# Altium footprint library 243-436_MP_Man-Ctrl-ESP32.PcbLib: 9 footprints
Each footprint in its own frame and in the unit in brackets; x right, y up, seen from the top. Pads: shape width x height; smd on the part's side, far side on the other; paste and mask are expansions set on the pad; w line width, h text height; cw(c..) or ccw(c..) is an arc to the next point about the centre after c.
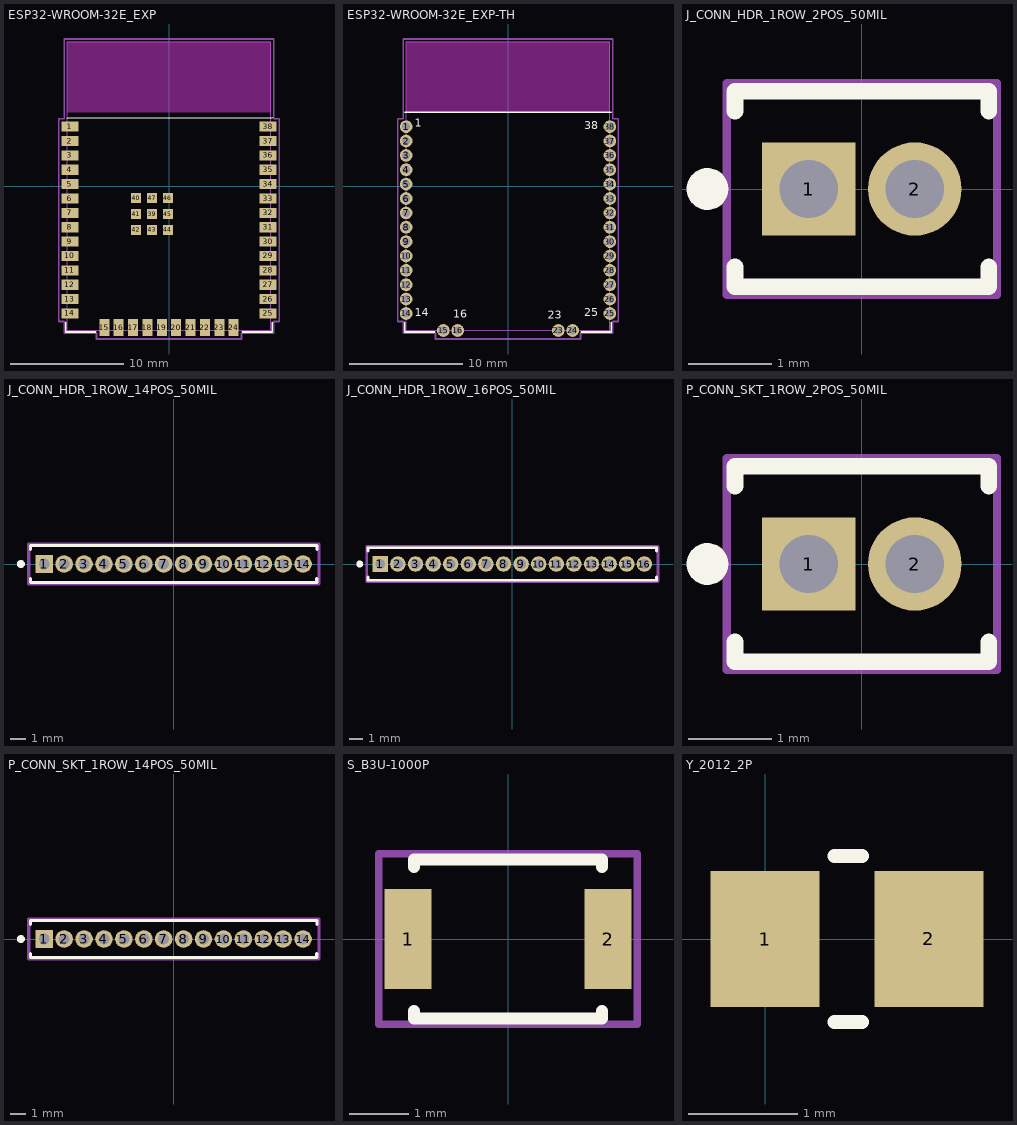
[diagram p0: the footprints below, top view; thin cyan lines are the x and y axes]

## ESP32­WROOM­32E_EXP [mil]
height 196.85
pads (47):
  rect 59x35 smd paste+0 mask+0: 1(-344.5,207.1) 2(-344.5,157.1) 3(-344.5,107.1) 4(-344.5,57.1) 5(-344.5,7.1) 6(-344.5,-42.9) 7(-344.5,-92.9) 8(-344.5,-142.9) 9(-344.5,-192.9) 10(-344.5,-242.9) 11(-344.5,-292.9) 12(-344.5,-342.9) 13(-344.5,-392.9) 14(-344.5,-442.9) 25(344.5,-442.9) 26(344.5,-392.9) 27(344.5,-342.9) 28(344.5,-292.9) 29(344.5,-242.9) 30(344.5,-192.9) 31(344.5,-142.9) 32(344.5,-92.9) 33(344.5,-42.9) 34(344.5,7.1) 35(344.5,57.1) 36(344.5,107.1) 37(344.5,157.1) 38(344.5,207.1)
  rect 35x59 smd paste+0 mask+0: 15(-225,-492.15) 16(-175,-492.15) 17(-125,-492.15) 18(-75,-492.15) 19(-25,-492.15) 20(25,-492.15) 21(75,-492.15) 22(125,-492.15) 23(175,-492.15) 24(225,-492.15)
  rect 35x35 smd paste+0 mask+0: 39(-59.1,-96.9) 40(-114.2,-41.8) 41(-114.2,-96.9) 42(-114.2,-152) 43(-59.1,-152) 44(-4,-152) 45(-4,-96.9) 46(-4,-41.8) 47(-59.1,-41.8)
Top Overlay:
  lines w6: -359.5,-473.5 -359.5,-507 -255.6,-507 ; -354.33,236.22 359.5,237.7 ; 255.6,-507 359.5,-507 359.5,-473.5
Keep-Out Layer:
  region: 354.5,258 354.5,502 -354.5,502 -354.5,258
Top Courtyard:
  lines w6: -384,-470.4 -364.5,-470.4 -364.5,-512 -252.5,-512 -252.5,-531.65 252.5,-531.65 252.5,-512 364.5,-512 364.5,-470.4 384,-470.4 384,234.6 364.5,234.6 364.5,512 -364.5,512 -364.5,234.6 -384,234.6 -384,-470.4
Top Designator:
  text ".Designator" at -68.9,-2.45 h39.37
Top 3D Body:
  lines w1: -354.5,-502 354.5,-502 354.5,502 -354.5,502 -354.5,-502
3D body "User Library-ESP32-WROOM-32E-1.STEP": height 124.02, standoff -0.71, extent -355.04,-502.68 355.04,501.97

## ESP32­WROOM­32E_EXP-TH [mm]
height 3
pads (32):
  round 1.12 hole 0.7 paste-2539.97 mask+0: 1(-9,5.26) 2(-9,3.99) 3(-9,2.72) 4(-9,1.45) 5(-9,0.18) 6(-9,-1.09) 7(-9,-2.36) 8(-9,-3.63) 9(-9,-4.9) 10(-9,-6.17) 11(-9,-7.44) 12(-9,-8.71) 13(-9,-9.98) 14(-9,-11.25) 15(-5.715,-12.751) 16(-4.445,-12.751) 23(4.445,-12.751) 24(5.715,-12.751) 25(9,-11.25) 26(9,-9.98) 27(9,-8.71) 28(9,-7.44) 29(9,-6.17) 30(9,-4.9) 31(9,-3.63) 32(9,-2.36) 33(9,-1.09) 34(9,0.18) 35(9,1.45) 36(9,2.72) 37(9,3.99) 38(9,5.26)
Top Overlay:
  lines w0.152: -9.131,-12.027 -9.131,-12.878 -6.492,-12.878 ; -9.131,6.528 9.131,6.528 ; 6.492,-12.878 9.131,-12.878 9.131,-12.027
  text "1" at -8.25,5 h1.2
  text "14" at -8.25,-11.75 h1.2
  text "23" at 3.499,-11.987 h1.2
  text "25" at 6.749,-11.737 h1.2
  text "38" at 6.75,4.763 h1.2
  text "16" at -4.85,-11.888 h1.2
Keep-Out Layer:
  region: 9.004,6.553 9.004,12.751 -9.004,12.751 -9.004,6.553
Top Courtyard:
  lines w0.152: -9.754,-11.948 -9.258,-11.948 -9.258,-13.005 -6.414,-13.005 -6.414,-13.504 6.413,-13.504 6.413,-13.005 9.258,-13.005 9.258,-11.948 9.754,-11.948 9.754,5.959 9.258,5.959 9.258,13.005 -9.258,13.005 -9.258,5.959 -9.754,5.959 -9.754,-11.948
Top Designator:
  text ".Designator" at -2.25,-0.312 h1
Top 3D Body:
  lines w0.025: -9.004,-12.751 9.004,-12.751 9.004,12.751 -9.004,12.751 -9.004,-12.751
3D body "User Library-ESP32-WROOM-32E-1.STEP": height 10.15, standoff 6.98, extent -9.018,-12.75 9.018,12.768
3D body "Conn_Sullins_GRPB021VWVN-RC_eec.STEP": height -2.9, standoff -9.6, extent -6.345,-13.822 -3.805,-11.681
3D body "Conn_Sullins_GRPB021VWVN-RC_eec.STEP": height -2.9, standoff -9.6, extent 3.815,-13.822 6.355,-11.681
3D body "GRPB141VWVN-RC.STEP": height 9.21, standoff 2.91, extent 7.934,-11.885 10.067,5.895
3D body "GRPB141VWVN-RC.STEP": height 9.21, standoff 2.91, extent -10.067,-11.885 -7.934,5.895

## J_CONN_HDR_1ROW_2POS_50MIL [mm]
height 8.58
pads (2):
  rect 1.12x1.12 hole 0.7 paste-2539.97 mask+0: 1(-0.635,0)
  round 1.12 hole 0.7 paste-2539.97 mask+0: 2(0.635,0)
Top Overlay:
  circle w0.25: c-1.85,0 r0.125
  lines w0.2: -1.52,-0.935 -1.52,-1.17 1.52,-1.17 1.52,-0.935 ; -1.52,0.935 -1.52,1.17 1.52,1.17 1.52,0.935
Top Courtyard:
  lines w0.1: -1.62,-1.27 1.62,-1.27 1.62,1.27 -1.62,1.27 -1.62,-1.27
Top Designator:
  text ".Designator" at 0,0.188 h1
3D body "Conn_Sullins_GRPB021VWVN-RC_eec.STEP": height 4.4, standoff -2.3, extent -1.275,-1.071 1.265,1.07

## J_CONN_HDR_1ROW_14POS_50MIL [mm]
height 8.58
pads (14):
  rect 1.12x1.12 hole 0.7 paste-2539.97 mask+0: 1(-8.255,0)
  round 1.12 hole 0.7 paste-2539.97 mask+0: 2(-6.985,0) 3(-5.715,0) 4(-4.445,0) 5(-3.175,0) 6(-1.905,0) 7(-0.635,0) 8(0.635,0) 9(1.905,0) 10(3.175,0) 11(4.445,0) 12(5.715,0) 13(6.985,0) 14(8.255,0)
Top Overlay:
  circle w0.25: c-9.74,0 r0.125
  lines w0.2: -9.14,-0.935 -9.14,-1.17 9.123,-1.17 9.123,-0.935 ; -9.14,0.935 -9.14,1.17 9.137,1.17 9.137,0.935
Top Courtyard:
  lines w0.2: -9.24,-1.27 9.27,-1.27 9.27,1.27 -9.24,1.27 -9.24,-1.27
Top Designator:
  text ".Designator" at -2.25,0.25 h1
3D body "GRPB141VWVN-RC.STEP": height 3.99, standoff -2.31, extent -8.89,-1.067 8.89,1.067

## J_CONN_HDR_1ROW_16POS_50MIL [mm]
height 8.58
pads (16):
  rect 1.12x1.12 hole 0.7 paste-2539.97 mask+0: 1(-9.525,0)
  round 1.12 hole 0.7 paste-2539.97 mask+0: 2(-8.255,0) 3(-6.985,0) 4(-5.715,0) 5(-4.445,0) 6(-3.175,0) 7(-1.905,0) 8(-0.635,0) 9(0.635,0) 10(1.905,0) 11(3.175,0) 12(4.445,0) 13(5.715,0) 14(6.985,0) 15(8.255,0) 16(9.525,0)
Top Overlay:
  circle w0.25: c-11.01,0 r0.125
  lines w0.2: -10.41,-0.935 -10.41,-1.17 10.41,-1.17 10.41,-0.935 ; -10.41,0.935 -10.41,1.17 10.41,1.17 10.41,0.935
Top Courtyard:
  lines w0.2: -10.51,-1.27 -10.51,1.27 10.51,1.27 10.51,-1.27 -10.51,-1.27
Top Designator:
  text ".Designator" at 0,0.188 h1
3D body "Conn_Sullins_GRPB161VWVN-RC_eec.STEP": height 4.4, standoff -2.3, extent -10.16,-1.072 10.16,1.07

## P_CONN_SKT_1ROW_2POS_50MIL [mm]
height 8.58
pads (2):
  rect 1.12x1.12 hole 0.7 paste-2539.97 mask+0: 1(-0.635,0)
  round 1.12 hole 0.7 paste-2539.97 mask+0: 2(0.635,0)
Top Overlay:
  circle w0.25: c-1.85,0 r0.125
  lines w0.2: -1.52,-0.935 -1.52,-1.17 1.52,-1.17 1.52,-0.935 ; -1.52,0.935 -1.52,1.17 1.52,1.17 1.52,0.935
Top Courtyard:
  lines w0.1: -1.62,-1.27 1.62,-1.27 1.62,1.27 -1.62,1.27 -1.62,-1.27
Top Designator:
  text ".Designator" at 0,0.188 h1
3D body "SLM-102-01-G-S.stp": height 4.57, standoff -2.92, extent -1.384,-1.27 1.384,1.27

## P_CONN_SKT_1ROW_14POS_50MIL [mm]
height 8.58
pads (14):
  rect 1.12x1.12 hole 0.7 paste-2539.97 mask+0: 1(-8.255,0)
  round 1.12 hole 0.7 paste-2539.97 mask+0: 2(-6.985,0) 3(-5.715,0) 4(-4.445,0) 5(-3.175,0) 6(-1.905,0) 7(-0.635,0) 8(0.635,0) 9(1.905,0) 10(3.175,0) 11(4.445,0) 12(5.715,0) 13(6.985,0) 14(8.255,0)
Top Overlay:
  circle w0.25: c-9.74,0 r0.125
  lines w0.2: -9.14,-0.935 -9.14,-1.17 9.123,-1.17 9.123,-0.935 ; -9.14,0.935 -9.14,1.17 9.137,1.17 9.137,0.935
Top Courtyard:
  lines w0.2: -9.24,-1.27 -9.24,1.27 9.27,1.27 9.27,-1.27 -9.24,-1.27
Top Designator:
  text ".Designator" at -2.25,0.25 h1
3D body "SLM-114-01-G-S.stp": height 4.57, standoff -2.92, extent -9.004,-1.27 9.004,1.27

## S_B3U-1000P [mm]
pads (2):
  rect 0.8x1.7 smd paste+0 mask+0: 1(-1.7,0) 2(1.7,0)
Top Overlay:
  lines w0.2: -1.6,-1.225 -1.6,-1.35 1.6,-1.35 1.6,-1.225 ; -1.6,1.225 -1.6,1.35 1.6,1.35 1.6,1.225
Top Courtyard:
  lines w0.125: -2.2,-1.45 -2.2,1.45 2.2,1.45 2.2,-1.45 -2.2,-1.45
Top Designator:
  text ".Designator" at -1.25,-0.062 h1
3D body "Switch_Omron_B3U-1000P_eec.STEP": height 1.6, standoff 0, extent -2,-1.256 2,1.244

## Y_2012_2P [mm]
height 0.55
pads (2):
  rect 1x1.25 smd: 1(0,0) 2(1.5,0)
Top Overlay:
  lines w0.127: 0.635,-0.762 0.889,-0.762 ; 0.635,0.762 0.889,0.762
3D body: height 0.75, standoff 0, extent -0.33,-0.762 1.88,0.762